# Altium footprint library PcbLib.PcbLib: 68 footprints (part 2 of 5)
Each footprint in its own frame and in the unit in brackets; x right, y up, seen from the top. Pads: shape width x height; smd on the part's side, far side on the other; paste and mask are expansions set on the pad; w line width, h text height; cw(c..) or ccw(c..) is an arc to the next point about the centre after c.
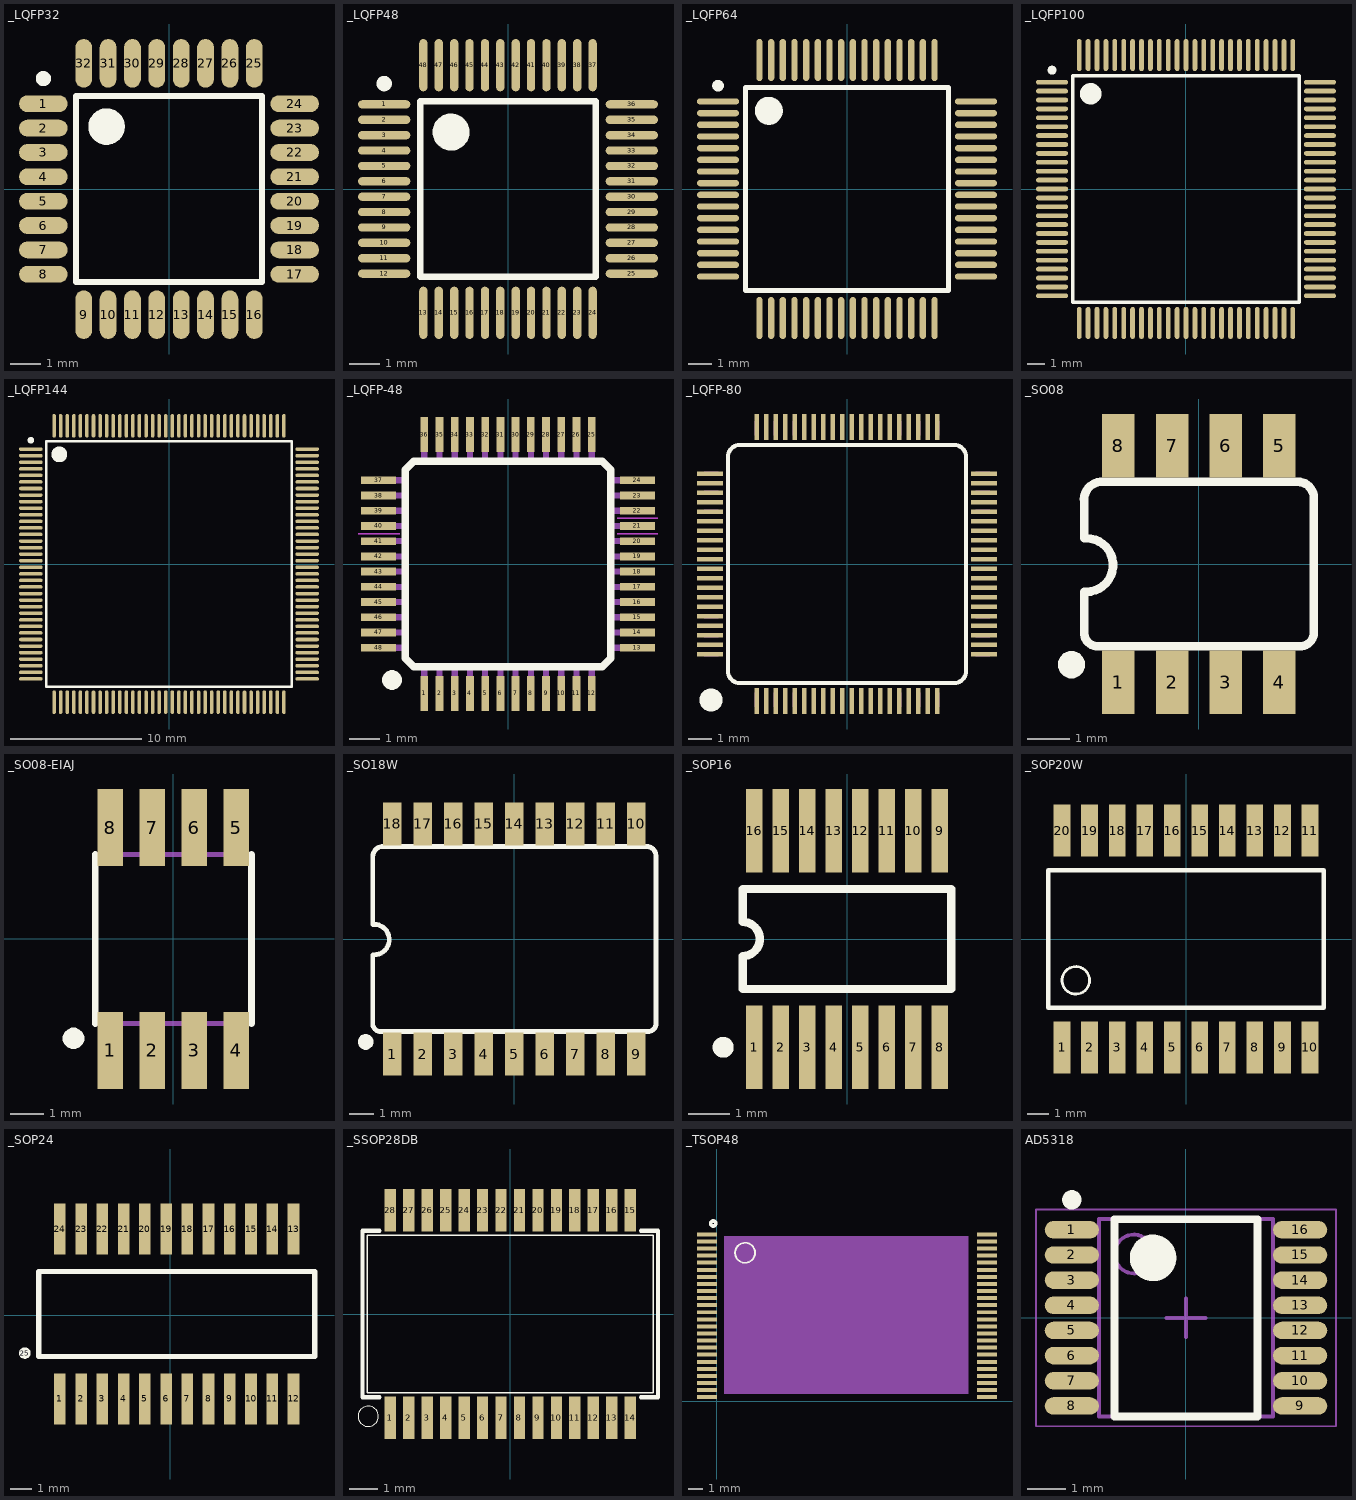
[diagram p1: the footprints below, top view; thin cyan lines are the x and y axes]

## _LQFP32 [mm] "QFP, 32-Leads, Body 7x7mm, Pitch 0.8mm, IPC High Density"
height 1.6
pads (32):
  oval 1.6x0.55 smd: 1(-4.125,2.8) 2(-4.125,2) 3(-4.125,1.2) 4(-4.125,0.4) 5(-4.125,-0.4) 6(-4.125,-1.2) 7(-4.125,-2) 8(-4.125,-2.8) 17(4.125,-2.8) 18(4.125,-2) 19(4.125,-1.2) 20(4.125,-0.4) 21(4.125,0.4) 22(4.125,1.2) 23(4.125,2) 24(4.125,2.8)
  oval 0.55x1.6 smd: 9(-2.8,-4.125) 10(-2,-4.125) 11(-1.2,-4.125) 12(-0.4,-4.125) 13(0.4,-4.125) 14(1.2,-4.125) 15(2,-4.125) 16(2.8,-4.125) 25(2.8,4.125) 26(2,4.125) 27(1.2,4.125) 28(0.4,4.125) 29(-0.4,4.125) 30(-1.2,4.125) 31(-2,4.125) 32(-2.8,4.125)
Top Overlay:
  circle w0.6: c-2.05,2.05 r0.3
  circle w0.25: c-4.125,3.625 r0.125
  lines w0.2: -3.05,-3.05 3.05,-3.05 3.05,3.05 -3.05,3.05 -3.05,-3.05

## _LQFP48 [mm] "QFP, 48-Leads, Body 7x7mm, Pitch 0.5mm, IPC High Density"
height 1.6
pads (48):
  oval 1.7x0.27 smd: 1(-4.025,2.75) 2(-4.025,2.25) 3(-4.025,1.75) 4(-4.025,1.25) 5(-4.025,0.75) 6(-4.025,0.25) 7(-4.025,-0.25) 8(-4.025,-0.75) 9(-4.025,-1.25) 10(-4.025,-1.75) 11(-4.025,-2.25) 12(-4.025,-2.75) 25(4.025,-2.75) 26(4.025,-2.25) 27(4.025,-1.75) 28(4.025,-1.25) 29(4.025,-0.75) 30(4.025,-0.25) 31(4.025,0.25) 32(4.025,0.75) 33(4.025,1.25) 34(4.025,1.75) 35(4.025,2.25) 36(4.025,2.75)
  oval 0.27x1.7 smd: 13(-2.75,-4.025) 14(-2.25,-4.025) 15(-1.75,-4.025) 16(-1.25,-4.025) 17(-0.75,-4.025) 18(-0.25,-4.025) 19(0.25,-4.025) 20(0.75,-4.025) 21(1.25,-4.025) 22(1.75,-4.025) 23(2.25,-4.025) 24(2.75,-4.025) 37(2.75,4.025) 38(2.25,4.025) 39(1.75,4.025) 40(1.25,4.025) 41(0.75,4.025) 42(0.25,4.025) 43(-0.25,4.025) 44(-0.75,4.025) 45(-1.25,4.025) 46(-1.75,4.025) 47(-2.25,4.025) 48(-2.75,4.025)
Top Overlay:
  circle w0.25: c-4.025,3.425 r0.125
  circle w0.6: c-1.85,1.85 r0.3
  lines w0.2: -2.85,-2.85 -2.85,2.85 2.85,2.85 2.85,-2.85 -2.85,-2.85

## _LQFP64 [mm] "Thin QFP, 64-Leads, Body 10x10mm, Pitch 0.5mm, IPC High Density"
height 1.6
pads (64):
  oval 1.8x0.27 smd: 1(-5.525,3.75) 2(-5.525,3.25) 3(-5.525,2.75) 4(-5.525,2.25) 5(-5.525,1.75) 6(-5.525,1.25) 7(-5.525,0.75) 8(-5.525,0.25) 9(-5.525,-0.25) 10(-5.525,-0.75) 11(-5.525,-1.25) 12(-5.525,-1.75) 13(-5.525,-2.25) 14(-5.525,-2.75) 15(-5.525,-3.25) 16(-5.525,-3.75) 33(5.525,-3.75) 34(5.525,-3.25) 35(5.525,-2.75) 36(5.525,-2.25) 37(5.525,-1.75) 38(5.525,-1.25) 39(5.525,-0.75) 40(5.525,-0.25) 41(5.525,0.25) 42(5.525,0.75) 43(5.525,1.25) 44(5.525,1.75) 45(5.525,2.25) 46(5.525,2.75) 47(5.525,3.25) 48(5.525,3.75)
  oval 0.27x1.8 smd: 17(-3.75,-5.525) 18(-3.25,-5.525) 19(-2.75,-5.525) 20(-2.25,-5.525) 21(-1.75,-5.525) 22(-1.25,-5.525) 23(-0.75,-5.525) 24(-0.25,-5.525) 25(0.25,-5.525) 26(0.75,-5.525) 27(1.25,-5.525) 28(1.75,-5.525) 29(2.25,-5.525) 30(2.75,-5.525) 31(3.25,-5.525) 32(3.75,-5.525) 49(3.75,5.525) 50(3.25,5.525) 51(2.75,5.525) 52(2.25,5.525) 53(1.75,5.525) 54(1.25,5.525) 55(0.75,5.525) 56(0.25,5.525) 57(-0.25,5.525) 58(-0.75,5.525) 59(-1.25,5.525) 60(-1.75,5.525) 61(-2.25,5.525) 62(-2.75,5.525) 63(-3.25,5.525) 64(-3.75,5.525)
Top Overlay:
  circle w0.25: c-5.525,4.425 r0.125
  circle w0.6: c-3.35,3.35 r0.3
  lines w0.2: -4.35,-4.35 -4.35,4.35 4.35,4.35 4.35,-4.35 -4.35,-4.35

## _LQFP100 [mm] "Thin QFP, 100-Leads, Body 14x14mm, Pitch 0.5mm, IPC High Density"
height 1.6
pads (100):
  oval 1.8x0.27 smd: 1(-7.525,6) 2(-7.525,5.5) 3(-7.525,5) 4(-7.525,4.5) 5(-7.525,4) 6(-7.525,3.5) 7(-7.525,3) 8(-7.525,2.5) 9(-7.525,2) 10(-7.525,1.5) 11(-7.525,1) 12(-7.525,0.5) 13(-7.525,0) 14(-7.525,-0.5) 15(-7.525,-1) 16(-7.525,-1.5) 17(-7.525,-2) 18(-7.525,-2.5) 19(-7.525,-3) 20(-7.525,-3.5) 21(-7.525,-4) 22(-7.525,-4.5) 23(-7.525,-5) 24(-7.525,-5.5) 25(-7.525,-6) 51(7.525,-6) 52(7.525,-5.5) 53(7.525,-5) 54(7.525,-4.5) 55(7.525,-4) 56(7.525,-3.5) 57(7.525,-3) 58(7.525,-2.5) 59(7.525,-2) 60(7.525,-1.5) 61(7.525,-1) 62(7.525,-0.5) 63(7.525,0) 64(7.525,0.5) 65(7.525,1) 66(7.525,1.5) 67(7.525,2) 68(7.525,2.5) 69(7.525,3) 70(7.525,3.5) 71(7.525,4) 72(7.525,4.5) 73(7.525,5) 74(7.525,5.5) 75(7.525,6)
  oval 0.27x1.8 smd: 26(-6,-7.525) 27(-5.5,-7.525) 28(-5,-7.525) 29(-4.5,-7.525) 30(-4,-7.525) 31(-3.5,-7.525) 32(-3,-7.525) 33(-2.5,-7.525) 34(-2,-7.525) 35(-1.5,-7.525) 36(-1,-7.525) 37(-0.5,-7.525) 38(0,-7.525) 39(0.5,-7.525) 40(1,-7.525) 41(1.5,-7.525) 42(2,-7.525) 43(2.5,-7.525) 44(3,-7.525) 45(3.5,-7.525) 46(4,-7.525) 47(4.5,-7.525) 48(5,-7.525) 49(5.5,-7.525) 50(6,-7.525) 76(6,7.525) 77(5.5,7.525) 78(5,7.525) 79(4.5,7.525) 80(4,7.525) 81(3.5,7.525) 82(3,7.525) 83(2.5,7.525) 84(2,7.525) 85(1.5,7.525) 86(1,7.525) 87(0.5,7.525) 88(0,7.525) 89(-0.5,7.525) 90(-1,7.525) 91(-1.5,7.525) 92(-2,7.525) 93(-2.5,7.525) 94(-3,7.525) 95(-3.5,7.525) 96(-4,7.525) 97(-4.5,7.525) 98(-5,7.525) 99(-5.5,7.525) 100(-6,7.525)
Top Overlay:
  circle w0.6: c-5.35,5.35 r0.3
  circle w0.25: c-7.525,6.675 r0.125
  lines w0.2: -6.35,-6.35 6.35,-6.35 6.35,6.35 -6.35,6.35 -6.35,-6.35

## _LQFP144 [mm] "Thin QFP, 144-Leads, Body 20x20mm, Pitch 0.5mm, IPC High Density"
height 1.6
pads (144):
  oval 1.8x0.27 smd: 1(-10.525,8.75) 2(-10.525,8.25) 3(-10.525,7.75) 4(-10.525,7.25) 5(-10.525,6.75) 6(-10.525,6.25) 7(-10.525,5.75) 8(-10.525,5.25) 9(-10.525,4.75) 10(-10.525,4.25) 11(-10.525,3.75) 12(-10.525,3.25) 13(-10.525,2.75) 14(-10.525,2.25) 15(-10.525,1.75) 16(-10.525,1.25) 17(-10.525,0.75) 18(-10.525,0.25) 19(-10.525,-0.25) 20(-10.525,-0.75) 21(-10.525,-1.25) 22(-10.525,-1.75) 23(-10.525,-2.25) 24(-10.525,-2.75) 25(-10.525,-3.25) 26(-10.525,-3.75) 27(-10.525,-4.25) 28(-10.525,-4.75) 29(-10.525,-5.25) 30(-10.525,-5.75) 31(-10.525,-6.25) 32(-10.525,-6.75) 33(-10.525,-7.25) 34(-10.525,-7.75) 35(-10.525,-8.25) 36(-10.525,-8.75) 73(10.525,-8.75) 74(10.525,-8.25) 75(10.525,-7.75) 76(10.525,-7.25) 77(10.525,-6.75) 78(10.525,-6.25) 79(10.525,-5.75) 80(10.525,-5.25) 81(10.525,-4.75) 82(10.525,-4.25) 83(10.525,-3.75) 84(10.525,-3.25) 85(10.525,-2.75) 86(10.525,-2.25) 87(10.525,-1.75) 88(10.525,-1.25) 89(10.525,-0.75) 90(10.525,-0.25) 91(10.525,0.25) 92(10.525,0.75) 93(10.525,1.25) 94(10.525,1.75) 95(10.525,2.25) 96(10.525,2.75) 97(10.525,3.25) 98(10.525,3.75) 99(10.525,4.25) 100(10.525,4.75) 101(10.525,5.25) 102(10.525,5.75) 103(10.525,6.25) 104(10.525,6.75) 105(10.525,7.25) 106(10.525,7.75) 107(10.525,8.25) 108(10.525,8.75)
  oval 0.27x1.8 smd: 37(-8.75,-10.525) 38(-8.25,-10.525) 39(-7.75,-10.525) 40(-7.25,-10.525) 41(-6.75,-10.525) 42(-6.25,-10.525) 43(-5.75,-10.525) 44(-5.25,-10.525) 45(-4.75,-10.525) 46(-4.25,-10.525) 47(-3.75,-10.525) 48(-3.25,-10.525) 49(-2.75,-10.525) 50(-2.25,-10.525) 51(-1.75,-10.525) 52(-1.25,-10.525) 53(-0.75,-10.525) 54(-0.25,-10.525) 55(0.25,-10.525) 56(0.75,-10.525) 57(1.25,-10.525) 58(1.75,-10.525) 59(2.25,-10.525) 60(2.75,-10.525) 61(3.25,-10.525) 62(3.75,-10.525) 63(4.25,-10.525) 64(4.75,-10.525) 65(5.25,-10.525) 66(5.75,-10.525) 67(6.25,-10.525) 68(6.75,-10.525) 69(7.25,-10.525) 70(7.75,-10.525) 71(8.25,-10.525) 72(8.75,-10.525) 109(8.75,10.525) 110(8.25,10.525) 111(7.75,10.525) 112(7.25,10.525) 113(6.75,10.525) 114(6.25,10.525) 115(5.75,10.525) 116(5.25,10.525) 117(4.75,10.525) 118(4.25,10.525) 119(3.75,10.525) 120(3.25,10.525) 121(2.75,10.525) 122(2.25,10.525) 123(1.75,10.525) 124(1.25,10.525) 125(0.75,10.525) 126(0.25,10.525) 127(-0.25,10.525) 128(-0.75,10.525) 129(-1.25,10.525) 130(-1.75,10.525) 131(-2.25,10.525) 132(-2.75,10.525) 133(-3.25,10.525) 134(-3.75,10.525) 135(-4.25,10.525) 136(-4.75,10.525) 137(-5.25,10.525) 138(-5.75,10.525) 139(-6.25,10.525) 140(-6.75,10.525) 141(-7.25,10.525) 142(-7.75,10.525) 143(-8.25,10.525) 144(-8.75,10.525)
Top Overlay:
  circle w0.25: c-10.525,9.425 r0.125
  circle w0.6: c-8.35,8.35 r0.3
  lines w0.2: -9.35,-9.35 -9.35,9.35 9.35,9.35 9.35,-9.35 -9.35,-9.35

## _LQFP-48 [mil]
pads (48):
  rect 10x45 smd: 1(-108.27,-167.32) 2(-88.58,-167.32) 3(-68.9,-167.32) 4(-49.21,-167.32) 5(-29.53,-167.32) 6(-9.84,-167.32) 7(9.84,-167.32) 8(29.53,-167.32) 9(49.21,-167.32) 10(68.9,-167.32) 11(88.58,-167.32) 12(108.27,-167.32) 25(108.27,167.32) 26(88.58,167.32) 27(68.9,167.32) 28(49.21,167.32) 29(29.53,167.32) 30(9.84,167.32) 31(-9.84,167.32) 32(-29.53,167.32) 33(-49.21,167.32) 34(-68.9,167.32) 35(-88.58,167.32) 36(-108.27,167.32)
  rect 45x10 smd: 13(167.32,-108.27) 14(167.32,-88.58) 15(167.32,-68.9) 16(167.32,-49.21) 17(167.32,-29.53) 18(167.32,-9.84) 19(167.32,9.84) 20(167.32,29.53) 21(167.32,49.21) 22(167.32,68.9) 23(167.32,88.58) 24(167.32,108.27) 37(-167.32,108.27) 38(-167.32,88.58) 39(-167.32,68.9) 40(-167.32,49.21) 41(-167.32,29.53) 42(-167.32,9.84) 43(-167.32,-9.84) 44(-167.32,-29.53) 45(-167.32,-49.21) 46(-167.32,-68.9) 47(-167.32,-88.58) 48(-167.32,-108.27)
Top Overlay:
  region: -137.5,-150 -137.5,-147.51 -139.4,-142.92 -142.92,-139.4 -147.51,-137.5 -150,-137.5 -152.49,-137.5 -157.08,-139.4 -160.6,-142.92 -162.5,-147.51 -162.5,-150 -162.5,-152.49 -160.6,-157.08 -157.08,-160.6 -152.49,-162.5 -150,-162.5 -147.51,-162.5 -142.92,-160.6 -139.4,-157.08 -137.5,-152.49
  lines w10: -132.87,-122.05 -132.87,122.05 -122.05,132.87 122.05,132.87 132.87,122.05 132.87,-122.05 122.05,-132.87 -122.05,-132.87 -132.87,-122.05
Mechanical 8 keep-out:
  rectangle: -194,38 -140,40
  rectangle: 141,38 194,40
  rectangle: 141,58 194,60
Mechanical 16:
  rectangle: -177.17,-112.2 -135.83,-104.33
  rectangle: -177.17,-92.52 -135.83,-84.65
  rectangle: -177.17,-72.83 -135.83,-64.96
  rectangle: -177.17,-53.15 -135.83,-45.28
  rectangle: -177.17,-33.46 -135.83,-25.59
  rectangle: -177.17,-13.78 -135.83,-5.91
  rectangle: -177.17,5.91 -135.83,13.78
  rectangle: -177.17,25.59 -135.83,33.46
  rectangle: -177.17,45.28 -135.83,53.15
  rectangle: -177.17,64.96 -135.83,72.83
  rectangle: -177.17,84.65 -135.83,92.52
  rectangle: -177.17,104.33 -135.83,112.2
  rectangle: -112.2,135.83 -104.33,177.17
  rectangle: -92.52,135.83 -84.65,177.17
  rectangle: -72.83,135.83 -64.96,177.17
  rectangle: -53.15,135.83 -45.28,177.17
  rectangle: -33.46,135.83 -25.59,177.17
  rectangle: -13.78,135.83 -5.91,177.17
  rectangle: 5.91,135.83 13.78,177.17
  rectangle: 25.59,135.83 33.46,177.17
  rectangle: 45.28,135.83 53.15,177.17
  rectangle: 64.96,135.83 72.83,177.17
  rectangle: 84.65,135.83 92.52,177.17
  rectangle: 104.33,135.83 112.2,177.17
  rectangle: 135.83,104.33 177.17,112.2
  rectangle: 135.83,84.65 177.17,92.52
  rectangle: 135.83,64.96 177.17,72.83
  rectangle: 135.83,45.28 177.17,53.15
  rectangle: 135.83,25.59 177.17,33.46
  rectangle: 135.83,5.91 177.17,13.78
  rectangle: 135.83,-13.78 177.17,-5.91
  rectangle: 135.83,-33.46 177.17,-25.59
  rectangle: 135.83,-53.15 177.17,-45.28
  rectangle: 135.83,-72.83 177.17,-64.96
  rectangle: 135.83,-92.52 177.17,-84.65
  rectangle: 135.83,-112.2 177.17,-104.33
  rectangle: 104.33,-177.17 112.2,-135.83
  rectangle: 84.65,-177.17 92.52,-135.83
  rectangle: 64.96,-177.17 72.83,-135.83
  rectangle: 45.28,-177.17 53.15,-135.83
  rectangle: 25.59,-177.17 33.46,-135.83
  rectangle: 5.91,-177.17 13.78,-135.83
  rectangle: -13.78,-177.17 -5.91,-135.83
  rectangle: -33.46,-177.17 -25.59,-135.83
  rectangle: -53.15,-177.17 -45.28,-135.83
  rectangle: -72.83,-177.17 -64.96,-135.83
  rectangle: -92.52,-177.17 -84.65,-135.83
  rectangle: -112.2,-177.17 -104.33,-135.83

## _LQFP-80 [mm]
pads (80):
  rect 0.19x1.1 smd: 1(-3.8,-5.75) 2(-3.4,-5.75) 3(-3,-5.75) 4(-2.6,-5.75) 5(-2.2,-5.75) 6(-1.8,-5.75) 7(-1.4,-5.75) 8(-1,-5.75) 9(-0.6,-5.75) 10(-0.2,-5.75) 11(0.2,-5.75) 12(0.6,-5.75) 13(1,-5.75) 14(1.4,-5.75) 15(1.8,-5.75) 16(2.2,-5.75) 17(2.6,-5.75) 18(3,-5.75) 19(3.4,-5.75) 20(3.8,-5.75) 41(3.8,5.75) 42(3.4,5.75) 43(3,5.75) 44(2.6,5.75) 45(2.2,5.75) 46(1.8,5.75) 47(1.4,5.75) 48(1,5.75) 49(0.6,5.75) 50(0.2,5.75) 51(-0.2,5.75) 52(-0.6,5.75) 53(-1,5.75) 54(-1.4,5.75) 55(-1.8,5.75) 56(-2.2,5.75) 57(-2.6,5.75) 58(-3,5.75) 59(-3.4,5.75) 60(-3.8,5.75)
  rect 1.1x0.19 smd: 21(5.75,-3.8) 22(5.75,-3.4) 23(5.75,-3) 24(5.75,-2.6) 25(5.75,-2.2) 26(5.75,-1.8) 27(5.75,-1.4) 28(5.75,-1) 29(5.75,-0.6) 30(5.75,-0.2) 31(5.75,0.2) 32(5.75,0.6) 33(5.75,1) 34(5.75,1.4) 35(5.75,1.8) 36(5.75,2.2) 37(5.75,2.6) 38(5.75,3) 39(5.75,3.4) 40(5.75,3.8) 61(-5.75,3.8) 62(-5.75,3.4) 63(-5.75,3) 64(-5.75,2.6) 65(-5.75,2.2) 66(-5.75,1.8) 67(-5.75,1.4) 68(-5.75,1) 69(-5.75,0.6) 70(-5.75,0.2) 71(-5.75,-0.2) 72(-5.75,-0.6) 73(-5.75,-1) 74(-5.75,-1.4) 75(-5.75,-1.8) 76(-5.75,-2.2) 77(-5.75,-2.6) 78(-5.75,-3) 79(-5.75,-3.4) 80(-5.75,-3.8)
Top Overlay:
  region: -6.191,-5.715 -6.191,-5.62 -6.119,-5.445 -5.985,-5.311 -5.81,-5.239 -5.715,-5.239 -5.62,-5.239 -5.445,-5.311 -5.311,-5.445 -5.239,-5.62 -5.239,-5.715 -5.239,-5.81 -5.311,-5.985 -5.445,-6.119 -5.62,-6.191 -5.715,-6.191 -5.81,-6.191 -5.985,-6.119 -6.119,-5.985 -6.191,-5.81
  lines w0.178: -5,-4.5 ccw(c-4.5,-4.5) -4.5,-5 4.5,-5 ccw(c4.5,-4.5) 5,-4.5 5,4.5 ccw(c4.5,4.5) 4.5,5 -4.5,5 ccw(c-4.5,4.5) -5,4.5 -5,-4.5
Mechanical 16:
  rectangle: -6,0.12 -5.4,0.28
  rectangle: -6,-0.28 -5.4,-0.12
  rectangle: -6,-0.68 -5.4,-0.52
  rectangle: -6,-1.08 -5.4,-0.92
  rectangle: -6,-1.48 -5.4,-1.32
  rectangle: -6,-1.88 -5.4,-1.72
  rectangle: -6,-2.28 -5.4,-2.12
  rectangle: -6,-2.68 -5.4,-2.52
  rectangle: -6,-3.08 -5.4,-2.92
  rectangle: -6,-3.48 -5.4,-3.32
  rectangle: -6,-3.88 -5.4,-3.72
  rectangle: -6,0.52 -5.4,0.68
  rectangle: -6,0.92 -5.4,1.08
  rectangle: -6,1.32 -5.4,1.48
  rectangle: -6,1.72 -5.4,1.88
  rectangle: -6,2.12 -5.4,2.28
  rectangle: -6,2.52 -5.4,2.68
  rectangle: -6,2.92 -5.4,3.08
  rectangle: -6,3.32 -5.4,3.48
  rectangle: -6,3.72 -5.4,3.88
  region: 0.12,6 0.12,5.4 0.28,5.4 0.28,6
  region: -0.28,6 -0.28,5.4 -0.12,5.4 -0.12,6
  region: -0.68,6 -0.68,5.4 -0.52,5.4 -0.52,6
  region: -1.08,6 -1.08,5.4 -0.92,5.4 -0.92,6
  region: -1.48,6 -1.48,5.4 -1.32,5.4 -1.32,6
  region: -1.88,6 -1.88,5.4 -1.72,5.4 -1.72,6
  region: -2.28,6 -2.28,5.4 -2.12,5.4 -2.12,6
  region: -2.68,6 -2.68,5.4 -2.52,5.4 -2.52,6
  region: -3.08,6 -3.08,5.4 -2.92,5.4 -2.92,6
  region: -3.48,6 -3.48,5.4 -3.32,5.4 -3.32,6
  region: -3.88,6 -3.88,5.4 -3.72,5.4 -3.72,6
  region: 0.52,6 0.52,5.4 0.68,5.4 0.68,6
  region: 0.92,6 0.92,5.4 1.08,5.4 1.08,6
  region: 1.32,6 1.32,5.4 1.48,5.4 1.48,6
  region: 1.72,6 1.72,5.4 1.88,5.4 1.88,6
  region: 2.12,6 2.12,5.4 2.28,5.4 2.28,6
  region: 2.52,6 2.52,5.4 2.68,5.4 2.68,6
  region: 2.92,6 2.92,5.4 3.08,5.4 3.08,6
  region: 3.32,6 3.32,5.4 3.48,5.4 3.48,6
  region: 3.72,6 3.72,5.4 3.88,5.4 3.88,6
  region: 6,-0.12 5.4,-0.12 5.4,-0.28 6,-0.28
  region: 6,0.28 5.4,0.28 5.4,0.12 6,0.12
  region: 6,0.68 5.4,0.68 5.4,0.52 6,0.52
  region: 6,1.08 5.4,1.08 5.4,0.92 6,0.92
  region: 6,1.48 5.4,1.48 5.4,1.32 6,1.32
  region: 6,1.88 5.4,1.88 5.4,1.72 6,1.72
  region: 6,2.28 5.4,2.28 5.4,2.12 6,2.12
  region: 6,2.68 5.4,2.68 5.4,2.52 6,2.52
  region: 6,3.08 5.4,3.08 5.4,2.92 6,2.92
  region: 6,3.48 5.4,3.48 5.4,3.32 6,3.32
  region: 6,3.88 5.4,3.88 5.4,3.72 6,3.72
  region: 6,-0.52 5.4,-0.52 5.4,-0.68 6,-0.68
  region: 6,-0.92 5.4,-0.92 5.4,-1.08 6,-1.08
  region: 6,-1.32 5.4,-1.32 5.4,-1.48 6,-1.48
  region: 6,-1.72 5.4,-1.72 5.4,-1.88 6,-1.88
  region: 6,-2.12 5.4,-2.12 5.4,-2.28 6,-2.28
  region: 6,-2.52 5.4,-2.52 5.4,-2.68 6,-2.68
  region: 6,-2.92 5.4,-2.92 5.4,-3.08 6,-3.08
  region: 6,-3.32 5.4,-3.32 5.4,-3.48 6,-3.48
  region: 6,-3.72 5.4,-3.72 5.4,-3.88 6,-3.88
  region: -0.12,-6 -0.12,-5.4 -0.28,-5.4 -0.28,-6
  region: 0.28,-6 0.28,-5.4 0.12,-5.4 0.12,-6
  region: 0.68,-6 0.68,-5.4 0.52,-5.4 0.52,-6
  region: 1.08,-6 1.08,-5.4 0.92,-5.4 0.92,-6
  region: 1.48,-6 1.48,-5.4 1.32,-5.4 1.32,-6
  region: 1.88,-6 1.88,-5.4 1.72,-5.4 1.72,-6
  region: 2.28,-6 2.28,-5.4 2.12,-5.4 2.12,-6
  region: 2.68,-6 2.68,-5.4 2.52,-5.4 2.52,-6
  region: 3.08,-6 3.08,-5.4 2.92,-5.4 2.92,-6
  region: 3.48,-6 3.48,-5.4 3.32,-5.4 3.32,-6
  region: 3.88,-6 3.88,-5.4 3.72,-5.4 3.72,-6
  region: -0.52,-6 -0.52,-5.4 -0.68,-5.4 -0.68,-6
  region: -0.92,-6 -0.92,-5.4 -1.08,-5.4 -1.08,-6
  region: -1.32,-6 -1.32,-5.4 -1.48,-5.4 -1.48,-6
  region: -1.72,-6 -1.72,-5.4 -1.88,-5.4 -1.88,-6
  region: -2.12,-6 -2.12,-5.4 -2.28,-5.4 -2.28,-6
  region: -2.52,-6 -2.52,-5.4 -2.68,-5.4 -2.68,-6
  region: -2.92,-6 -2.92,-5.4 -3.08,-5.4 -3.08,-6
  region: -3.32,-6 -3.32,-5.4 -3.48,-5.4 -3.48,-6
  region: -3.72,-6 -3.72,-5.4 -3.88,-5.4 -3.88,-6

## _SO08 [mm]
pads (8):
  rect 0.77x1.5 smd: 1(-1.905,-2.8) 2(-0.635,-2.8) 3(0.635,-2.8) 4(1.905,-2.8) 5(1.905,2.8) 6(0.635,2.8) 7(-0.635,2.8) 8(-1.905,2.8)
Top Overlay:
  region: -2.699,-2.381 -2.699,-2.318 -2.747,-2.201 -2.836,-2.112 -2.953,-2.064 -3.016,-2.064 -3.079,-2.064 -3.196,-2.112 -3.285,-2.201 -3.334,-2.318 -3.334,-2.381 -3.334,-2.444 -3.285,-2.561 -3.196,-2.65 -3.079,-2.699 -3.016,-2.699 -2.953,-2.699 -2.836,-2.65 -2.747,-2.561 -2.699,-2.444
  lines w0.203: -2.718,-0.66 -2.718,-1.665 ccw(c-2.387,-1.616) -2.337,-1.946 2.437,-1.946 ccw(c2.387,-1.615) 2.718,-1.565 2.718,1.565 ccw(c2.337,1.566) 2.337,1.946 -2.337,1.946 ccw(c-2.287,1.515) -2.718,1.465 ; -2.718,0.61 -2.718,1.453 ; -2.667,-0.66 ccw(c-2.667,-0.025) -2.667,0.61
Mechanical 16:
  rectangle: -2.159,2.286 -1.651,3.302
  rectangle: 1.651,2.286 2.159,3.302
  rectangle: 0.381,2.286 0.889,3.302
  rectangle: -0.889,2.286 -0.381,3.302
  rectangle: 1.651,-3.302 2.159,-2.273
  rectangle: 0.381,-3.302 0.889,-2.273
  rectangle: -0.889,-3.302 -0.381,-2.273
  rectangle: -2.159,-3.302 -1.651,-2.273

## _SO08-EIAJ [mm]
pads (8):
  rect 0.77x2.33 smd: 1(-1.905,-3.378) 2(-0.635,-3.378) 3(0.635,-3.378) 4(1.905,-3.378) 5(1.905,3.353) 6(0.635,3.353) 7(-0.635,3.353) 8(-1.905,3.353)
Top Overlay:
  region: -2.699,-3.016 -2.699,-2.953 -2.747,-2.836 -2.836,-2.747 -2.953,-2.699 -3.016,-2.699 -3.079,-2.699 -3.196,-2.747 -3.285,-2.836 -3.334,-2.953 -3.334,-3.016 -3.334,-3.079 -3.285,-3.196 -3.196,-3.285 -3.079,-3.334 -3.016,-3.334 -2.953,-3.334 -2.836,-3.285 -2.747,-3.196 -2.699,-3.079
  lines w0.203: -2.362,-2.565 -2.362,2.539 ; 2.362,-2.565 2.362,2.539
Mechanical 16:
  rectangle: 1.727,2.591 2.083,3.607
  rectangle: 0.457,2.591 0.813,3.607
  rectangle: -0.813,2.591 -0.457,3.607
  rectangle: -2.083,2.591 -1.727,3.607
  rectangle: 1.727,-3.632 2.083,-2.616
  rectangle: 0.457,-3.632 0.813,-2.616
  rectangle: -0.813,-3.632 -0.457,-2.616
  rectangle: -2.083,-3.632 -1.727,-2.616
  lines w0.152: -2.362,-2.565 2.362,-2.565 ; -2.362,2.539 2.362,2.539

## _SO18W [mm]
pads (18):
  rect 0.77x1.8 smd: 1(-5.08,-4.788) 2(-3.81,-4.788) 3(-2.54,-4.788) 4(-1.27,-4.788) 5(0,-4.788) 6(1.27,-4.788) 7(2.54,-4.788) 8(3.81,-4.788) 9(5.08,-4.788) 10(5.08,4.788) 11(3.81,4.788) 12(2.54,4.788) 13(1.27,4.788) 14(0,4.788) 15(-1.27,4.788) 16(-2.54,4.788) 17(-3.81,4.788) 18(-5.08,4.788)
Top Overlay:
  region: -5.874,-4.286 -5.874,-4.223 -5.922,-4.106 -6.011,-4.017 -6.128,-3.969 -6.191,-3.969 -6.254,-3.969 -6.371,-4.017 -6.46,-4.106 -6.509,-4.223 -6.509,-4.286 -6.509,-4.349 -6.46,-4.466 -6.371,-4.555 -6.254,-4.604 -6.191,-4.604 -6.128,-4.604 -6.011,-4.555 -5.922,-4.466 -5.874,-4.349
  lines w0.203: -5.893,-0.66 -5.893,-3.57 ccw(c-5.562,-3.521) -5.512,-3.851 5.612,-3.851 ccw(c5.562,-3.52) 5.893,-3.47 5.893,3.47 ccw(c5.512,3.471) 5.512,3.851 -5.512,3.851 ccw(c-5.462,3.42) -5.893,3.37 ; -5.893,0.61 -5.893,3.358 ; -5.842,-0.66 ccw(c-5.842,-0.025) -5.842,0.61

## _SOP16 [mm] "SSOP; 16 Leads; Body Width 3.9 mm; Pitch 0.635 mm"
height 1.76
pads (16):
  rect 0.4x2 smd: 1(-2.222,-2.6) 2(-1.587,-2.6) 3(-0.953,-2.6) 4(-0.318,-2.6) 5(0.318,-2.6) 6(0.953,-2.6) 7(1.587,-2.6) 8(2.222,-2.6) 9(2.222,2.6) 10(1.587,2.6) 11(0.953,2.6) 12(0.318,2.6) 13(-0.318,2.6) 14(-0.953,2.6) 15(-1.587,2.6) 16(-2.222,2.6)
Top Overlay:
  circle w0.25: c-2.973,-2.6 r0.125
  lines w0.2: -2.5,-1.2 -2.5,-0.408 ccw(c-2.5,0) -2.5,0.408 -2.5,1.2 2.5,1.2 2.5,-1.2 -2.5,-1.2

## _SOP20W [mm]
pads (20):
  rect 0.77x2.4 smd: 1(-5.715,-5) 2(-4.445,-5) 3(-3.175,-5) 4(-1.905,-5) 5(-0.635,-5) 6(0.635,-5) 7(1.905,-5) 8(3.175,-5) 9(4.445,-5) 10(5.715,-5) 11(5.715,5) 12(4.445,5) 13(3.175,5) 14(1.905,5) 15(0.635,5) 16(-0.635,5) 17(-1.905,5) 18(-3.175,5) 19(-4.445,5) 20(-5.715,5)
Top Overlay:
  circle w0.127: c-5.08,-1.905 r0.635
  lines w0.203: -6.35,-3.175 6.35,-3.175 6.35,3.175 -6.35,3.175 -6.35,-3.175

## _SOP24 [mm]
pads (25):
  rect 0.55x2.4 smd: 1(-5.207,-3.937) 2(-4.207,-3.937) 3(-3.207,-3.937) 4(-2.207,-3.937) 5(-1.207,-3.937) 6(-0.207,-3.937) 7(0.793,-3.937) 8(1.793,-3.937) 9(2.793,-3.937) 10(3.793,-3.937) 11(4.793,-3.937) 12(5.793,-3.937) 13(5.793,4.063) 14(4.793,4.063) 15(3.793,4.063) 16(2.793,4.063) 17(1.793,4.063) 18(0.793,4.063) 19(-0.207,4.063) 20(-1.207,4.063) 21(-2.207,4.063) 22(-3.207,4.063) 23(-4.207,4.063) 24(-5.207,4.063)
  round 0.55 on Top Overlay: 25(-6.858,-1.778)
Top Overlay:
  lines w0.25: -6.207,-1.937 6.793,-1.937 6.793,2.063 -6.207,2.063 -6.207,-1.937

## _SSOP28DB [mm]
pads (28):
  rect 0.4x1.5 smd: 1(-4.225,-3.656) 2(-3.575,-3.656) 3(-2.925,-3.656) 4(-2.275,-3.656) 5(-1.625,-3.656) 6(-0.975,-3.656) 7(-0.325,-3.656) 8(0.325,-3.656) 9(0.975,-3.656) 10(1.625,-3.656) 11(2.275,-3.656) 12(2.925,-3.656) 13(3.575,-3.656) 14(4.225,-3.656) 15(4.225,3.656) 16(3.575,3.656) 17(2.925,3.656) 18(2.275,3.656) 19(1.625,3.656) 20(0.975,3.656) 21(0.325,3.656) 22(-0.325,3.656) 23(-0.975,3.656) 24(-1.625,3.656) 25(-2.275,3.656) 26(-2.925,3.656) 27(-3.575,3.656) 28(-4.225,3.656)
Top Overlay:
  circle w0: c-5,-3.6 r0.359
  lines w0.051: -5.038,-2.763 -5.038,2.763 5.038,2.763 5.038,-2.763 -5.038,-2.763
  lines w0.152: -4.6,-2.925 -5.2,-2.925 -5.2,2.925 -4.6,2.925 ; 4.6,-2.925 5.2,-2.925 5.2,2.925 4.6,2.925

## _TSOP48 [mm]
pads (48):
  rect 1.4x0.28 smd: 1(-0.7,11.8) 2(-0.7,11.3) 3(-0.7,10.8) 4(-0.7,10.3) 5(-0.7,9.8) 6(-0.7,9.3) 7(-0.7,8.8) 8(-0.7,8.3) 9(-0.7,7.8) 10(-0.7,7.3) 11(-0.7,6.8) 12(-0.7,6.3) 13(-0.7,5.8) 14(-0.7,5.3) 15(-0.7,4.8) 16(-0.7,4.3) 17(-0.7,3.8) 18(-0.7,3.3) 19(-0.7,2.8) 20(-0.7,2.3) 21(-0.7,1.8) 22(-0.7,1.3) 23(-0.7,0.8) 24(-0.7,0.3) 25(19.1,0.3) 26(19.1,0.8) 27(19.1,1.3) 28(19.1,1.8) 29(19.1,2.3) 30(19.1,2.8) 31(19.1,3.3) 32(19.1,3.8) 33(19.1,4.3) 34(19.1,4.8) 35(19.1,5.3) 36(19.1,5.8) 37(19.1,6.3) 38(19.1,6.8) 39(19.1,7.3) 40(19.1,7.8) 41(19.1,8.3) 42(19.1,8.8) 43(19.1,9.3) 44(19.1,9.8) 45(19.1,10.3) 46(19.1,10.8) 47(19.1,11.3) 48(19.1,11.8)
Top Overlay:
  circle w0.127: c2,10.5 r0.707
  circle w0.254: c-0.254,12.573 r0.18
Mechanical 16:
  rectangle: 0.508,0.508 17.78,11.684

## AD5318 [mm] "SPI Digital to Analog Converter"
height 1.2
pads (16):
  oval 1.4x0.45 smd: 1(-2.95,2.275) 2(-2.95,1.625) 3(-2.95,0.975) 4(-2.95,0.325) 5(-2.95,-0.325) 6(-2.95,-0.975) 7(-2.95,-1.625) 8(-2.95,-2.275) 9(2.95,-2.275) 10(2.95,-1.625) 11(2.95,-0.975) 12(2.95,-0.325) 13(2.95,0.325) 14(2.95,0.975) 15(2.95,1.625) 16(2.95,2.275)
Top Overlay:
  circle w0.6: c-0.85,1.55 r0.3
  circle w0.25: c-2.95,3.05 r0.125
  lines w0.2: -1.85,-2.55 1.85,-2.55 1.85,2.55 -1.85,2.55 -1.85,-2.55
Mechanical 13:
  circle w0.1: c-1.35,1.65 r0.5
  lines w0.1: -2.25,-2.55 2.25,-2.55 2.25,2.55 -2.25,2.55 -2.25,-2.55
Mechanical 15:
  lines w0.05: -3.875,-2.8 3.875,-2.8 3.875,2.8 -3.875,2.8 -3.875,-2.8
  lines w0.1: -0.5,0 0.5,0 ; 0,-0.5 0,0.5
3D body: height 1.2, standoff 0.1, extent -2.25,-2.55 2.25,2.55